# Altium footprint library Connectors Pad Lib.PcbLib: 211 footprints (part 10 of 14)
Each footprint in its own frame and in the unit in brackets; x right, y up, seen from the top. Pads: shape width x height; smd on the part's side, far side on the other; paste and mask are expansions set on the pad; w line width, h text height; cw(c..) or ccw(c..) is an arc to the next point about the centre after c.
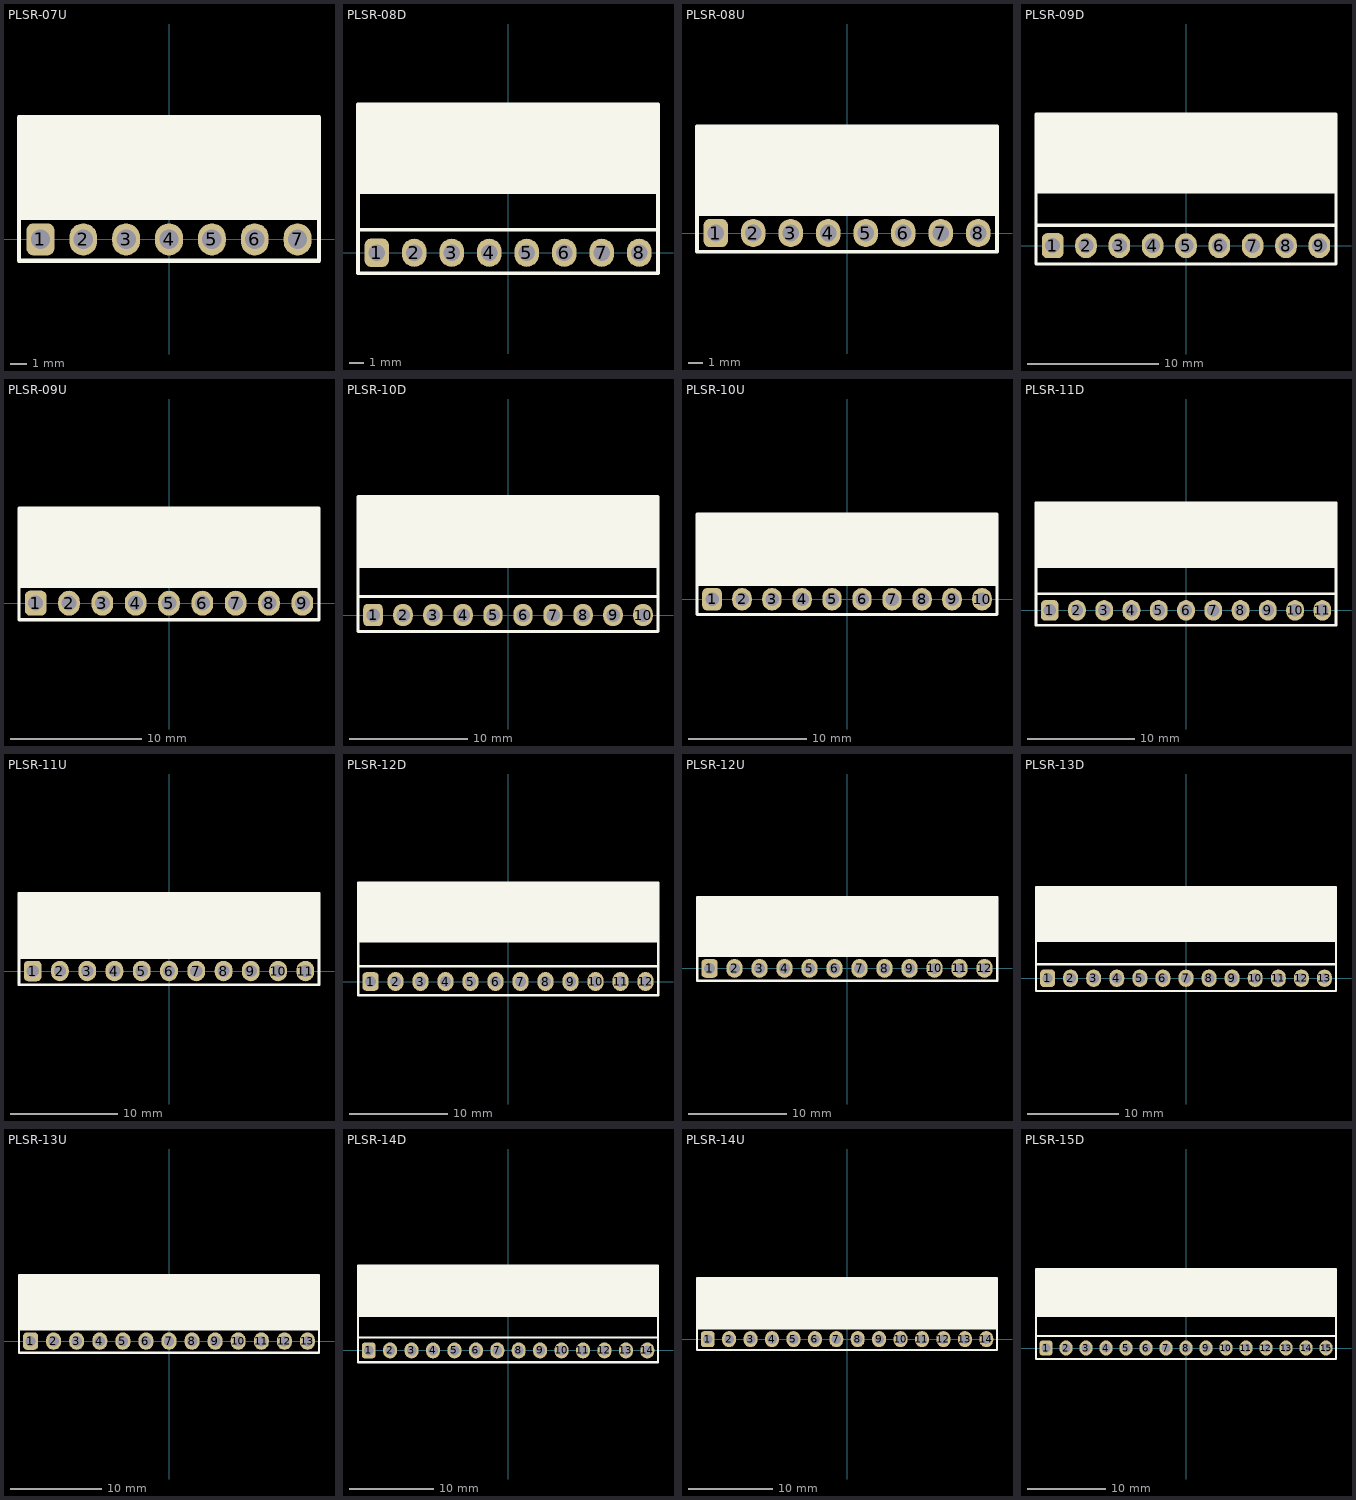
[diagram p9: the footprints below, top view; thin cyan lines are the x and y axes]

## PLSR-07U [mil] "PCB Right Angled Single Connector (U Type) 7-Pin"
height 236.3
pads (7):
  rrect50% 65x75 hole 45: 1(-300,0)
  oval 65x75 hole 45: 2(-200,0) 3(-100,0) 4(0,0) 5(100,0) 6(200,0) 7(300,0)
Top Overlay:
  rectangle: -350,50 350,285
  lines w10: -350,50 350,50 ; -350,-50 350,-50 350,285 -350,285 -350,-50
3D body "PLSRU-07.STEP": height 239.98, standoff -117.11, extent -350,-50 350,286.22

## PLSR-08D [mil] "PCB Right Angled Single Connector (D Type) 8-Pin"
height 98.42
pads (8):
  rrect50% 65x75 hole 45: 1(-350,0)
  oval 65x75 hole 45: 2(-250,0) 3(-150,0) 4(-50,0) 5(50,0) 6(150,0) 7(250,0) 8(350,0)
Top Overlay:
  rectangle: -400,161 400,395
  lines w10: -400,61 400,61 ; -400,161 400,161 ; -400,-55 400,-55 400,395 -400,395 -400,-55
3D body "PLSR-08D.STEP": height 101, standoff -117.11, extent -400,-11.02 400,396.85

## PLSR-08U [mil] "PCB Right Angled Single Connector (U Type) 8-Pin"
height 236.3
pads (8):
  rrect50% 65x75 hole 45: 1(-350,0)
  oval 65x75 hole 45: 2(-250,0) 3(-150,0) 4(-50,0) 5(50,0) 6(150,0) 7(250,0) 8(350,0)
Top Overlay:
  rectangle: -400,50 400,285
  lines w10: -400,50 400,50 ; -400,-50 -400,285 400,285 400,-50 -400,-50
3D body "PLSRU-08.STEP": height 239.98, standoff -117.11, extent -400,-50 400,286.22

## PLSR-09D [mil] "PCB Right Angled Single Connector (D Type) 9-Pin"
height 98.42
pads (9):
  rrect50% 65x75 hole 45: 1(-400,0)
  oval 65x75 hole 45: 2(-300,0) 3(-200,0) 4(-100,0) 5(0,0) 6(100,0) 7(200,0) 8(300,0) 9(400,0)
Top Overlay:
  rectangle: -450,160 450,395
  lines w10: -450,61 450,61 ; -450,161 450,161 ; -450,-55 450,-55 450,395 -450,395 -450,-55
3D body "PLSR-09D.STEP": height 101, standoff -117.11, extent -450,-11.02 450,396.85

## PLSR-09U [mil] "PCB Right Angled Single Connector (U Type) 9-Pin"
height 236.3
pads (9):
  rrect50% 65x75 hole 45: 1(-400,0)
  oval 65x75 hole 45: 2(-300,0) 3(-200,0) 4(-100,0) 5(0,0) 6(100,0) 7(200,0) 8(300,0) 9(400,0)
Top Overlay:
  rectangle: -450,50 450,285
  lines w10: -450,50 450,50 ; -450,-50 450,-50 450,285 -450,285 -450,-50
3D body "PLSRU-09.STEP": height 239.98, standoff -117.11, extent -450,-50 450,286.22

## PLSR-10D [mil] "PCB Right Angled Single Connector (D Type) 10-Pin"
height 98.42
pads (10):
  rrect50% 65x75 hole 45: 1(-450,0)
  oval 65x75 hole 45: 2(-350,0) 3(-250,0) 4(-150,0) 5(-50,0) 6(50,0) 7(150,0) 8(250,0) 9(350,0) 10(450,0)
Top Overlay:
  rectangle: -500,161 500,395
  lines w10: -500,61 500,61 ; -500,161 500,161 ; -500,-55 500,-55 500,395 -500,395 -500,-55
3D body "PLSR-10D.STEP": height 101, standoff -117.11, extent -500,-11.02 500,396.85

## PLSR-10U [mil] "PCB Right Angled Single Connector (U Type) 10-Pin"
height 236.3
pads (10):
  rrect50% 65x75 hole 45: 1(-450,0)
  oval 65x75 hole 45: 2(-350,0) 3(-250,0) 4(-150,0) 5(-50,0) 6(50,0) 7(150,0) 8(250,0) 9(350,0) 10(450,0)
Top Overlay:
  rectangle: -500,50 500,285
  lines w10: -500,50 500,50 ; -500,-50 -500,285 500,285 500,-50 -500,-50
3D body "PLSRU-10.STEP": height 239.98, standoff -117.11, extent -500,-50 500,286.22

## PLSR-11D [mil] "PCB Right Angled Single Connector (D Type) 11-Pin"
height 98.42
pads (11):
  rrect50% 65x75 hole 45: 1(-500,0)
  oval 65x75 hole 45: 2(-400,0) 3(-300,0) 4(-200,0) 5(-100,0) 6(0,0) 7(100,0) 8(200,0) 9(300,0) 10(400,0) 11(500,0)
Top Overlay:
  rectangle: -550,161 550,395
  lines w10: -550,61 550,61 ; -550,161 550,161 ; -550,-55 -550,395 550,395 550,-55 -550,-55
3D body "PLSR-11D.STEP": height 101, standoff -117.11, extent -550,-11.02 550,396.85

## PLSR-11U [mil] "PCB Right Angled Single Connector (U Type) 11-Pin"
height 236.3
pads (11):
  rrect50% 65x75 hole 45: 1(-500,0)
  oval 65x75 hole 45: 2(-400,0) 3(-300,0) 4(-200,0) 5(-100,0) 6(0,0) 7(100,0) 8(200,0) 9(300,0) 10(400,0) 11(500,0)
Top Overlay:
  rectangle: -550,50 550,285
  lines w10: -550,50 550,50 ; -550,-50 -550,285 550,285 550,-50 -550,-50
3D body "PLSRU-11.STEP": height 239.98, standoff -117.11, extent -550,-50 550,286.22

## PLSR-12D [mil] "PCB Right Angled Single Connector (D Type) 12-Pin"
height 98.42
pads (12):
  rrect50% 65x75 hole 45: 1(-550,0)
  oval 65x75 hole 45: 2(-450,0) 3(-350,0) 4(-250,0) 5(-150,0) 6(-50,0) 7(50,0) 8(150,0) 9(250,0) 10(350,0) 11(450,0) 12(550,0)
Top Overlay:
  rectangle: -600,161 600,395
  lines w10: -600,61 600,61 ; -600,161 600,161 ; -600,-55 -600,395 600,395 600,-55 -600,-55
3D body "PLSR-12D.STEP": height 101, standoff -117.11, extent -600,-11.02 600,396.85

## PLSR-12U [mil] "PCB Right Angled Single Connector (U Type) 12-Pin"
height 236.3
pads (12):
  rrect50% 65x75 hole 45: 1(-550,0)
  oval 65x75 hole 45: 2(-450,0) 3(-350,0) 4(-250,0) 5(-150,0) 6(-50,0) 7(50,0) 8(150,0) 9(250,0) 10(350,0) 11(450,0) 12(550,0)
Top Overlay:
  rectangle: -600,50 600,285
  lines w10: -600,50 600,50 ; -600,-50 -600,285 600,285 600,-50 -600,-50
3D body "PLSRU-12.STEP": height 239.98, standoff -117.11, extent -600,-50 600,286.22

## PLSR-13D [mil] "PCB Right Angled Single Connector (D Type) 13-Pin"
height 98.42
pads (13):
  rrect50% 65x75 hole 45: 1(-600,0)
  oval 65x75 hole 45: 2(-500,0) 3(-400,0) 4(-300,0) 5(-200,0) 6(-100,0) 7(0,0) 8(100,0) 9(200,0) 10(300,0) 11(400,0) 12(500,0) 13(600,0)
Top Overlay:
  rectangle: -650,161 650,395
  lines w10: -650,61 650,61 ; -650,161 650,161 ; -650,-55 -650,395 650,395 650,-55 -650,-55
3D body "PLSR-13D.STEP": height 101, standoff -117.11, extent -650,-11.02 650,396.85

## PLSR-13U [mil] "PCB Right Angled Single Connector (U Type) 13-Pin"
height 236.3
pads (13):
  rrect50% 65x75 hole 45: 1(-600,0)
  oval 65x75 hole 45: 2(-500,0) 3(-400,0) 4(-300,0) 5(-200,0) 6(-100,0) 7(0,0) 8(100,0) 9(200,0) 10(300,0) 11(400,0) 12(500,0) 13(600,0)
Top Overlay:
  rectangle: -650,50 650,285
  lines w10: -650,50 650,50 ; -650,-50 -650,285 650,285 650,-50 -650,-50
3D body "PLSRU-13.STEP": height 239.98, standoff -117.11, extent -650,-50 650,286.22

## PLSR-14D [mil] "PCB Right Angled Single Connector (D Type) 14-Pin"
height 98.42
pads (14):
  rrect50% 65x75 hole 45: 1(-650,0)
  oval 65x75 hole 45: 2(-550,0) 3(-450,0) 4(-350,0) 5(-250,0) 6(-150,0) 7(-50,0) 8(50,0) 9(150,0) 10(250,0) 11(350,0) 12(450,0) 13(550,0) 14(650,0)
Top Overlay:
  rectangle: -700,161 700,395
  lines w10: -700,61 695,61 ; -700,161 700,161 ; -700,-55 -700,395 700,395 700,-55 -700,-55
3D body "PLSR-14D.STEP": height 101, standoff -117.11, extent -700,-11.02 700,396.85

## PLSR-14U [mil] "PCB Right Angled Single Connector (U Type) 14-Pin"
height 236.3
pads (14):
  rrect50% 65x75 hole 45: 1(-650,0)
  oval 65x75 hole 45: 2(-550,0) 3(-450,0) 4(-350,0) 5(-250,0) 6(-150,0) 7(-50,0) 8(50,0) 9(150,0) 10(250,0) 11(350,0) 12(450,0) 13(550,0) 14(650,0)
Top Overlay:
  rectangle: -700,50 700,285
  lines w10: -700,50 695,50 ; -700,-50 -700,285 700,285 700,-50 -700,-50
3D body "PLSRU-14.STEP": height 239.98, standoff -117.11, extent -700,-50 700,286.22

## PLSR-15D [mil] "PCB Right Angled Single Connector (D Type) 15-Pin"
height 98.42
pads (15):
  rrect50% 65x75 hole 45: 1(-700,0)
  oval 65x75 hole 45: 2(-600,0) 3(-500,0) 4(-400,0) 5(-300,0) 6(-200,0) 7(-100,0) 8(0,0) 9(100,0) 10(200,0) 11(300,0) 12(400,0) 13(500,0) 14(600,0) 15(700,0)
Top Overlay:
  rectangle: -750,161 750,395
  lines w10: -750,61 750,61 ; -750,161 750,161 ; -750,-55 -750,395 750,395 750,-55 -750,-55
3D body "PLSR-15D.STEP": height 101, standoff -117.11, extent -750,-11.02 750,396.85